# Altium footprint library Metric_SMD.PcbLib: 185 footprints (part 12 of 12)
Each footprint in its own frame and in the unit in brackets; x right, y up, seen from the top. Pads: shape width x height; smd on the part's side, far side on the other; paste and mask are expansions set on the pad; w line width, h text height; cw(c..) or ccw(c..) is an arc to the next point about the centre after c.
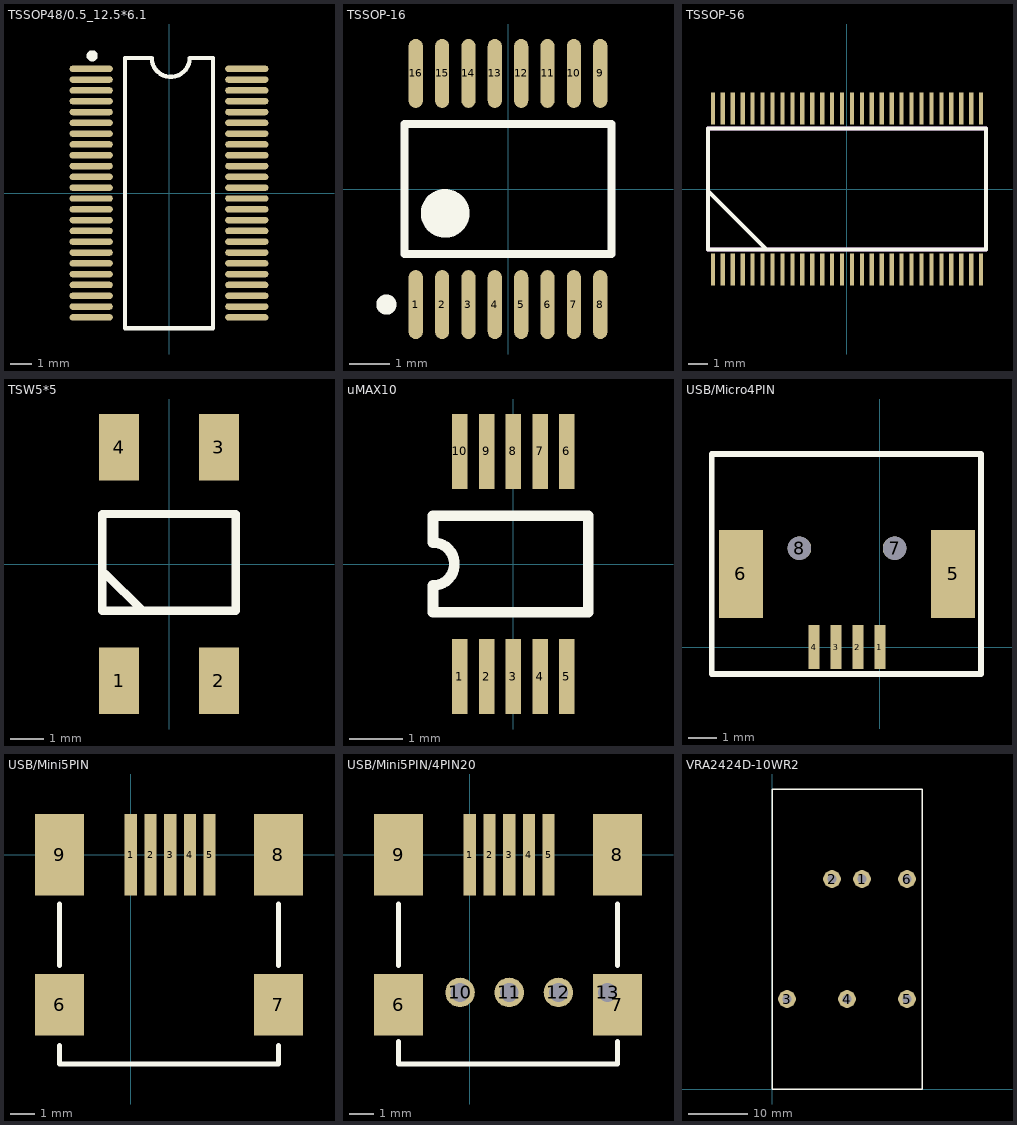
[diagram p11: the footprints below, top view; thin cyan lines are the x and y axes]

## TSSOP48/0.5_12.5*6.1 [mm] "TSSOP, 48-Leads, Body 12.5x6.1mm , Pitch 0.5mm,"
height 1.2
pads (48):
  oval 2x0.3 smd: 1(-3.6,5.75) 2(-3.6,5.25) 3(-3.6,4.75) 4(-3.6,4.25) 5(-3.6,3.75) 6(-3.6,3.25) 7(-3.6,2.75) 8(-3.6,2.25) 9(-3.6,1.75) 10(-3.6,1.25) 11(-3.6,0.75) 12(-3.6,0.25) 13(-3.6,-0.25) 14(-3.6,-0.75) 15(-3.6,-1.25) 16(-3.6,-1.75) 17(-3.6,-2.25) 18(-3.6,-2.75) 19(-3.6,-3.25) 20(-3.6,-3.75) 21(-3.6,-4.25) 22(-3.6,-4.75) 23(-3.6,-5.25) 24(-3.6,-5.75) 25(3.6,-5.75) 26(3.6,-5.25) 27(3.6,-4.75) 28(3.6,-4.25) 29(3.6,-3.75) 30(3.6,-3.25) 31(3.6,-2.75) 32(3.6,-2.25) 33(3.6,-1.75) 34(3.6,-1.25) 35(3.6,-0.75) 36(3.6,-0.25) 37(3.6,0.25) 38(3.6,0.75) 39(3.6,1.25) 40(3.6,1.75) 41(3.6,2.25) 42(3.6,2.75) 43(3.6,3.25) 44(3.6,3.75) 45(3.6,4.25) 46(3.6,4.75) 47(3.6,5.25) 48(3.6,5.75)
Top Overlay:
  circle w0.254: c-3.556,6.35 r0.127
  lines w0.2: -0.874,6.25 -2.032,6.25 -2.032,-6.25 2.032,-6.25 2.032,6.25 0.98,6.25 ; -0.8,6.25 ccw(c0.078,6.25) 0.957,6.25

## TSSOP-16 [mm] "TSOP, 16-Leads, Body 5.1x4.5mm (max), Pitch 0.65mm, IPC Medium Density"
height 1.2
pads (16):
  oval 0.35x1.7 smd: 1(-2.275,-2.85) 2(-1.625,-2.85) 3(-0.975,-2.85) 4(-0.325,-2.85) 5(0.325,-2.85) 6(0.975,-2.85) 7(1.625,-2.85) 8(2.275,-2.85) 9(2.275,2.85) 10(1.625,2.85) 11(0.975,2.85) 12(0.325,2.85) 13(-0.325,2.85) 14(-0.975,2.85) 15(-1.625,2.85) 16(-2.275,2.85)
Top Overlay:
  circle w0.6: c-1.55,-0.6 r0.3
  circle w0.25: c-3,-2.85 r0.125
  lines w0.2: -2.55,-1.6 -2.55,1.6 2.55,1.6 2.55,-1.6 -2.55,-1.6
3D body "User Library-IPC SOSOP65P640X120-16N MO-153AB RU-16.STEP": height 1.35, standoff 0, extent -2.54,-3.279 2.56,3.177

## TSSOP-56 [mm] "pitch0.5mm"
pads (56):
  rect 0.21x1.6 smd: 1(-6.75,-4.05) 2(-6.25,-4.05) 3(-5.75,-4.05) 4(-5.25,-4.05) 5(-4.75,-4.05) 6(-4.25,-4.05) 7(-3.75,-4.05) 8(-3.25,-4.05) 9(-2.75,-4.05) 10(-2.25,-4.05) 11(-1.75,-4.05) 12(-1.25,-4.05) 13(-0.75,-4.05) 14(-0.25,-4.05) 15(0.25,-4.05) 16(0.75,-4.05) 17(1.25,-4.05) 18(1.75,-4.05) 19(2.25,-4.05) 20(2.75,-4.05) 21(3.25,-4.05) 22(3.75,-4.05) 23(4.25,-4.05) 24(4.75,-4.05) 25(5.25,-4.05) 26(5.75,-4.05) 27(6.25,-4.05) 28(6.75,-4.05) 29(6.75,4.05) 30(6.25,4.05) 31(5.75,4.05) 32(5.25,4.05) 33(4.75,4.05) 34(4.25,4.05) 35(3.75,4.05) 36(3.25,4.05) 37(2.75,4.05) 38(2.25,4.05) 39(1.75,4.05) 40(1.25,4.05) 41(0.75,4.05) 42(0.25,4.05) 43(-0.25,4.05) 44(-0.75,4.05) 45(-1.25,4.05) 46(-1.75,4.05) 47(-2.25,4.05) 48(-2.75,4.05) 49(-3.25,4.05) 50(-3.75,4.05) 51(-4.25,4.05) 52(-4.75,4.05) 53(-5.25,4.05) 54(-5.75,4.05) 55(-6.25,4.05) 56(-6.75,4.05)
Top Overlay:
  lines w0.2: -6.95,-0.15 -4.05,-3.05 ; -7,-3.05 -7,3.05 7,3.05 7,-3.05 -7,-3.05
Mechanical 13:
  lines w0.2: -7,-3.05 7,-3.05 7,3.05 -7,3.05 -7,-3.05
3D body: height 0.8, standoff 0, extent -6.95,-3.05 7.05,3.05

## TSW5*5 [mm] "微动开关，表贴5x5"
height 3
pads (4):
  rect 1.2x2 smd: 1(-1.5,-3.5) 2(1.5,-3.5) 3(1.5,3.5) 4(-1.5,3.5)
Top Overlay:
  lines w0.254: -1.9,-0.3 -0.8,-1.4 ; -2,-1.4 2,-1.4 2,1.5 -2,1.5 -2,-1.4

## uMAX10 [mm] "uMAX-10pin, maxiam IC,0.5mm间距"
height 1.2
pads (10):
  rect 0.29x1.4 smd: 1(-1,-2.1) 2(-0.5,-2.1) 3(0,-2.1) 4(0.5,-2.1) 5(1,-2.1) 6(1,2.1) 7(0.5,2.1) 8(0,2.1) 9(-0.5,2.1) 10(-1,2.1)
Top Overlay:
  lines w0.2: -1.5,-0.9 1.4,-0.9 1.4,0.9 -1.5,0.9 -1.5,0.4 cw(c-1.5,0) -1.5,-0.4 -1.5,-0.9
3D body: height 0.8, standoff 0, extent -1.5,-1.4 1.4,1.5

## USB/Micro4PIN [mil]
height 157.48
pads (8):
  rect 15x60 smd: 1(0,0) 2(-30,0) 3(-60,0) 4(-90,0)
  rect 60x120 smd: 5(100,100) 6(-190,100)
  round 32 hole 32: 7(20,135) 8(-110,135)
Top Overlay:
  lines w7.87: -110,-37 138,-37 138,264 -230,264 -230,-37 -106,-37

## USB/Mini5PIN [mm]
height 4
pads (9):
  rect 0.5x3.3 smd: 1(0,0) 2(0.8,0) 3(1.6,0) 4(2.4,0) 5(3.2,0)
  rect 2x2.5 smd: 6(-2.9,-6.1) 7(6,-6.1)
  rect 2x3.3 smd: 8(6,0) 9(-2.9,0)
Top Overlay:
  lines w0.2: -2.9,-7.75 -2.9,-8.5 6,-8.5 6,-7.75 ; -2.9,-4.5 -2.9,-2 ; 6,-4.5 6,-2
3D body: height 3, standoff 0.1, extent -3,-8.5 6,-4
3D body: height 3, standoff 0.1, extent -2.3,-4 5.5,0.7

## USB/Mini5PIN/4PIN20 [mm] "USBmini5Pcompatible4Pin"
height 4
pads (13):
  rect 0.5x3.3 smd: 1(0,0) 2(0.8,0) 3(1.6,0) 4(2.4,0) 5(3.2,0)
  rect 2x2.5 smd: 6(-2.9,-6.1) 7(6,-6.1)
  rect 2x3.3 smd: 8(6,0) 9(-2.9,0)
  round 1.2 hole 0.762: 10(-0.4,-5.6) 11(1.6,-5.6) 12(3.6,-5.6) 13(5.6,-5.6)
Top Overlay:
  lines w0.2: -2.9,-7.6 -2.9,-8.5 6,-8.5 6,-7.6 ; -2.9,-4.5 -2.9,-2 ; 6,-4.5 6,-2

## VRA2424D-10WR2 [mm]
height 10.5
pads (6):
  round 3 hole 1.5: 1(15.24,35.56) 2(10.16,35.56) 3(2.54,15.24) 4(12.7,15.24) 5(22.86,15.24) 6(22.86,35.56)
Top Overlay:
  lines w0.254: 0,0 0,50.8 25.4,50.8 25.4,0 0,0
3D body: height 12, standoff 0, extent 0,0 25.4,50.8